# Altium footprint library Package_DFN_QFN.PcbLib: 557 footprints (part 20 of 35)
Each footprint in its own frame and in the unit in brackets; x right, y up, seen from the top. Pads: shape width x height; smd on the part's side, far side on the other; paste and mask are expansions set on the pad; w line width, h text height; cw(c..) or ccw(c..) is an arc to the next point about the centre after c.
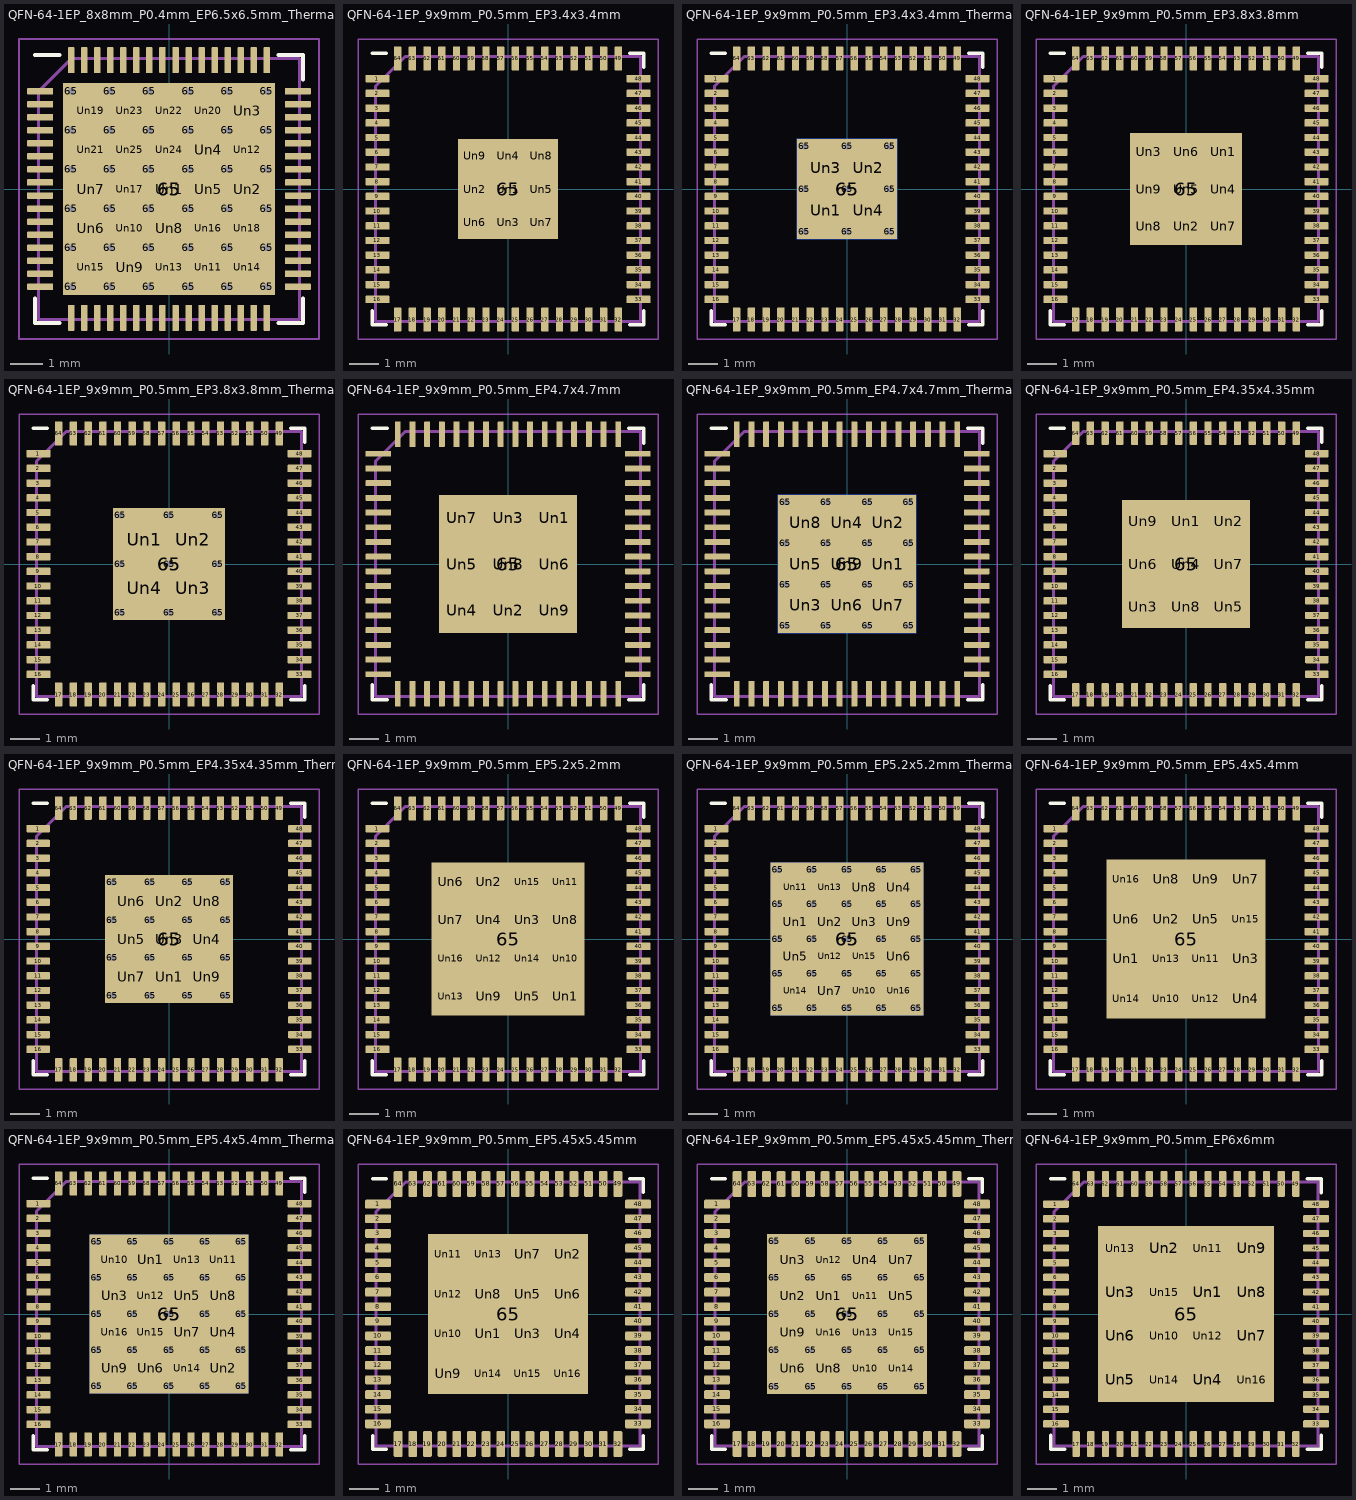
[diagram p19: the footprints below, top view; thin cyan lines are the x and y axes]

## QFN-64-1EP_8x8mm_P0.4mm_EP6.5x6.5mm_ThermalVias [mm]
pads (127):
  rrect25% 0.8x0.2 smd: 1(-3.95,3) 2(-3.95,2.6) 3(-3.95,2.2) 4(-3.95,1.8) 5(-3.95,1.4) 6(-3.95,1) 7(-3.95,0.6) 8(-3.95,0.2) 9(-3.95,-0.2) 10(-3.95,-0.6) 11(-3.95,-1) 12(-3.95,-1.4) 13(-3.95,-1.8) 14(-3.95,-2.2) 15(-3.95,-2.6) 16(-3.95,-3) 33(3.95,-3) 34(3.95,-2.6) 35(3.95,-2.2) 36(3.95,-1.8) 37(3.95,-1.4) 38(3.95,-1) 39(3.95,-0.6) 40(3.95,-0.2) 41(3.95,0.2) 42(3.95,0.6) 43(3.95,1) 44(3.95,1.4) 45(3.95,1.8) 46(3.95,2.2) 47(3.95,2.6) 48(3.95,3)
  rrect25% 0.2x0.8 smd: 17(-3,-3.95) 18(-2.6,-3.95) 19(-2.2,-3.95) 20(-1.8,-3.95) 21(-1.4,-3.95) 22(-1,-3.95) 23(-0.6,-3.95) 24(-0.2,-3.95) 25(0.2,-3.95) 26(0.6,-3.95) 27(1,-3.95) 28(1.4,-3.95) 29(1.8,-3.95) 30(2.2,-3.95) 31(2.6,-3.95) 32(3,-3.95) 49(3,3.95) 50(2.6,3.95) 51(2.2,3.95) 52(1.8,3.95) 53(1.4,3.95) 54(1,3.95) 55(0.6,3.95) 56(0.2,3.95) 57(-0.2,3.95) 58(-0.6,3.95) 59(-1,3.95) 60(-1.4,3.95) 61(-1.8,3.95) 62(-2.2,3.95) 63(-2.6,3.95) 64(-3,3.95)
  round 0.5 hole 0.2: 65(-3,-3) 65(-3,-1.8) 65(-3,-0.6) 65(-3,0.6) 65(-3,1.8) 65(-3,3) 65(-1.8,-3) 65(-1.8,-1.8) 65(-1.8,-0.6) 65(-1.8,0.6) 65(-1.8,1.8) 65(-1.8,3) 65(-0.6,-3) 65(-0.6,-1.8) 65(-0.6,-0.6) 65(-0.6,0.6) 65(-0.6,1.8) 65(-0.6,3) 65(0.6,-3) 65(0.6,-1.8) 65(0.6,-0.6) 65(0.6,0.6) 65(0.6,1.8) 65(0.6,3) 65(1.8,-3) 65(1.8,-1.8) 65(1.8,-0.6) 65(1.8,0.6) 65(1.8,1.8) 65(1.8,3) 65(3,-3) 65(3,-1.8) 65(3,-0.6) 65(3,0.6) 65(3,1.8) 65(3,3)
  rect 6.5x6.5 smd far side: 65(0,0)
  rect 6.5x6.5 smd: 65(0,0)
  rrect25% 1.007x1.007 on Top Paste: Un1(0,0) Un2(2.4,0) Un3(2.4,2.4) Un4(1.2,1.2) Un5(1.2,0) Un6(-2.4,-1.2) Un7(-2.4,0) Un8(0,-1.2) Un9(-1.2,-2.4) Un10(-1.2,-1.2) Un11(1.2,-2.4) Un12(2.4,1.2) Un13(0,-2.4) Un14(2.4,-2.4) Un15(-2.4,-2.4) Un16(1.2,-1.2) Un17(-1.2,0) Un18(2.4,-1.2) Un19(-2.4,2.4) Un20(1.2,2.4) Un21(-2.4,1.2) Un22(0,2.4) Un23(-1.2,2.4) Un24(0,1.2) Un25(-1.2,1.2)
F.SilkS:
  lines w0.12: -4.11,-3.36 -4.11,-4.11 -3.36,-4.11 ; -4.11,4.11 -3.36,4.11 ; 3.36,-4.11 4.11,-4.11 4.11,-3.36 ; 3.36,4.11 4.11,4.11 4.11,3.36
F.CrtYd:
  lines w0.05: -4.6,-4.6 -4.6,4.6 4.6,4.6 4.6,-4.6 -4.6,-4.6
F.Fab:
  lines w0.1: -4,-4 -4,3 -3,4 4,4 4,-4 -4,-4
  text "'.Designator'" at -4.047,-0.84 h1

## QFN-64-1EP_9x9mm_P0.5mm_EP3.4x3.4mm [mm]
pads (74):
  rrect25% 0.825x0.25 smd: 1(-4.437,3.75) 2(-4.437,3.25) 3(-4.437,2.75) 4(-4.437,2.25) 5(-4.437,1.75) 6(-4.437,1.25) 7(-4.437,0.75) 8(-4.437,0.25) 9(-4.437,-0.25) 10(-4.437,-0.75) 11(-4.437,-1.25) 12(-4.437,-1.75) 13(-4.437,-2.25) 14(-4.437,-2.75) 15(-4.437,-3.25) 16(-4.437,-3.75) 33(4.437,-3.75) 34(4.437,-3.25) 35(4.437,-2.75) 36(4.437,-2.25) 37(4.437,-1.75) 38(4.437,-1.25) 39(4.437,-0.75) 40(4.437,-0.25) 41(4.437,0.25) 42(4.437,0.75) 43(4.437,1.25) 44(4.437,1.75) 45(4.437,2.25) 46(4.437,2.75) 47(4.437,3.25) 48(4.437,3.75)
  rrect25% 0.25x0.825 smd: 17(-3.75,-4.437) 18(-3.25,-4.437) 19(-2.75,-4.437) 20(-2.25,-4.437) 21(-1.75,-4.437) 22(-1.25,-4.437) 23(-0.75,-4.437) 24(-0.25,-4.437) 25(0.25,-4.437) 26(0.75,-4.437) 27(1.25,-4.437) 28(1.75,-4.437) 29(2.25,-4.437) 30(2.75,-4.437) 31(3.25,-4.437) 32(3.75,-4.437) 49(3.75,4.437) 50(3.25,4.437) 51(2.75,4.437) 52(2.25,4.437) 53(1.75,4.437) 54(1.25,4.437) 55(0.75,4.437) 56(0.25,4.437) 57(-0.25,4.437) 58(-0.75,4.437) 59(-1.25,4.437) 60(-1.75,4.437) 61(-2.25,4.437) 62(-2.75,4.437) 63(-3.25,4.437) 64(-3.75,4.437)
  rect 3.4x3.4 smd: 65(0,0)
  rrect25% 0.91x0.91 on Top Paste: Un1(0,0) Un2(-1.13,0) Un3(0,-1.13) Un4(0,1.13) Un5(1.13,0) Un6(-1.13,-1.13) Un7(1.13,-1.13) Un8(1.13,1.13) Un9(-1.13,1.13)
F.SilkS:
  lines w0.12: -4.61,-4.135 -4.61,-4.61 -4.135,-4.61 ; -4.61,4.61 -4.135,4.61 ; 4.135,-4.61 4.61,-4.61 4.61,-4.135 ; 4.135,4.61 4.61,4.61 4.61,4.135
F.CrtYd:
  lines w0.05: -5.1,-5.1 5.1,-5.1 5.1,5.1 -5.1,5.1 -5.1,-5.1
F.Fab:
  lines w0.1: -4.5,-4.5 4.5,-4.5 4.5,4.5 -3.5,4.5 -4.5,3.5 -4.5,-4.5
  text "'.Designator'" at -4.047,-0.84 h1

## QFN-64-1EP_9x9mm_P0.5mm_EP3.4x3.4mm_ThermalVias [mm]
pads (79):
  rrect25% 0.825x0.25 smd: 1(-4.437,3.75) 2(-4.437,3.25) 3(-4.437,2.75) 4(-4.437,2.25) 5(-4.437,1.75) 6(-4.437,1.25) 7(-4.437,0.75) 8(-4.437,0.25) 9(-4.437,-0.25) 10(-4.437,-0.75) 11(-4.437,-1.25) 12(-4.437,-1.75) 13(-4.437,-2.25) 14(-4.437,-2.75) 15(-4.437,-3.25) 16(-4.437,-3.75) 33(4.437,-3.75) 34(4.437,-3.25) 35(4.437,-2.75) 36(4.437,-2.25) 37(4.437,-1.75) 38(4.437,-1.25) 39(4.437,-0.75) 40(4.437,-0.25) 41(4.437,0.25) 42(4.437,0.75) 43(4.437,1.25) 44(4.437,1.75) 45(4.437,2.25) 46(4.437,2.75) 47(4.437,3.25) 48(4.437,3.75)
  rrect25% 0.25x0.825 smd: 17(-3.75,-4.437) 18(-3.25,-4.437) 19(-2.75,-4.437) 20(-2.25,-4.437) 21(-1.75,-4.437) 22(-1.25,-4.437) 23(-0.75,-4.437) 24(-0.25,-4.437) 25(0.25,-4.437) 26(0.75,-4.437) 27(1.25,-4.437) 28(1.75,-4.437) 29(2.25,-4.437) 30(2.75,-4.437) 31(3.25,-4.437) 32(3.75,-4.437) 49(3.75,4.437) 50(3.25,4.437) 51(2.75,4.437) 52(2.25,4.437) 53(1.75,4.437) 54(1.25,4.437) 55(0.75,4.437) 56(0.25,4.437) 57(-0.25,4.437) 58(-0.75,4.437) 59(-1.25,4.437) 60(-1.75,4.437) 61(-2.25,4.437) 62(-2.75,4.437) 63(-3.25,4.437) 64(-3.75,4.437)
  round 0.5 hole 0.2: 65(-1.45,-1.45) 65(-1.45,0) 65(-1.45,1.45) 65(0,-1.45) 65(0,0) 65(0,1.45) 65(1.45,-1.45) 65(1.45,0) 65(1.45,1.45)
  rect 3.4x3.4 smd far side: 65(0,0)
  rect 3.4x3.4 smd: 65(0,0)
  round 1.227 on Top Paste: Un1(-0.725,-0.725) Un2(0.725,0.725) Un3(-0.725,0.725) Un4(0.725,-0.725)
F.SilkS:
  lines w0.12: -4.61,-4.135 -4.61,-4.61 -4.135,-4.61 ; -4.61,4.61 -4.135,4.61 ; 4.135,-4.61 4.61,-4.61 4.61,-4.135 ; 4.135,4.61 4.61,4.61 4.61,4.135
F.Paste:
  region: -0.184,-0.303 -0.184,-1.147 -0.303,-1.266 -1.147,-1.266 -1.266,-1.147 -1.266,-0.303 -1.147,-0.184 -0.303,-0.184
  region: 1.266,1.147 1.266,0.303 1.147,0.184 0.303,0.184 0.184,0.303 0.184,1.147 0.303,1.266 1.147,1.266
  region: -0.184,1.147 -0.184,0.303 -0.303,0.184 -1.147,0.184 -1.266,0.303 -1.266,1.147 -1.147,1.266 -0.303,1.266
  region: 1.266,-0.303 1.266,-1.147 1.147,-1.266 0.303,-1.266 0.184,-1.147 0.184,-0.303 0.303,-0.184 1.147,-0.184
F.CrtYd:
  lines w0.05: -5.1,-5.1 -5.1,5.1 5.1,5.1 5.1,-5.1 -5.1,-5.1
F.Fab:
  lines w0.1: -4.5,-4.5 -4.5,3.5 -3.5,4.5 4.5,4.5 4.5,-4.5 -4.5,-4.5
  text "'.Designator'" at -4.047,-0.84 h1

## QFN-64-1EP_9x9mm_P0.5mm_EP3.8x3.8mm [mm]
pads (74):
  rrect25% 0.825x0.25 smd: 1(-4.437,3.75) 2(-4.437,3.25) 3(-4.437,2.75) 4(-4.437,2.25) 5(-4.437,1.75) 6(-4.437,1.25) 7(-4.437,0.75) 8(-4.437,0.25) 9(-4.437,-0.25) 10(-4.437,-0.75) 11(-4.437,-1.25) 12(-4.437,-1.75) 13(-4.437,-2.25) 14(-4.437,-2.75) 15(-4.437,-3.25) 16(-4.437,-3.75) 33(4.437,-3.75) 34(4.437,-3.25) 35(4.437,-2.75) 36(4.437,-2.25) 37(4.437,-1.75) 38(4.437,-1.25) 39(4.437,-0.75) 40(4.437,-0.25) 41(4.437,0.25) 42(4.437,0.75) 43(4.437,1.25) 44(4.437,1.75) 45(4.437,2.25) 46(4.437,2.75) 47(4.437,3.25) 48(4.437,3.75)
  rrect25% 0.25x0.825 smd: 17(-3.75,-4.437) 18(-3.25,-4.437) 19(-2.75,-4.437) 20(-2.25,-4.437) 21(-1.75,-4.437) 22(-1.25,-4.437) 23(-0.75,-4.437) 24(-0.25,-4.437) 25(0.25,-4.437) 26(0.75,-4.437) 27(1.25,-4.437) 28(1.75,-4.437) 29(2.25,-4.437) 30(2.75,-4.437) 31(3.25,-4.437) 32(3.75,-4.437) 49(3.75,4.437) 50(3.25,4.437) 51(2.75,4.437) 52(2.25,4.437) 53(1.75,4.437) 54(1.25,4.437) 55(0.75,4.437) 56(0.25,4.437) 57(-0.25,4.437) 58(-0.75,4.437) 59(-1.25,4.437) 60(-1.75,4.437) 61(-2.25,4.437) 62(-2.75,4.437) 63(-3.25,4.437) 64(-3.75,4.437)
  rect 3.8x3.8 smd: 65(0,0)
  rrect25% 1.02x1.02 on Top Paste: Un1(1.27,1.27) Un2(0,-1.27) Un3(-1.27,1.27) Un4(1.27,0) Un5(0,0) Un6(0,1.27) Un7(1.27,-1.27) Un8(-1.27,-1.27) Un9(-1.27,0)
F.SilkS:
  lines w0.12: -4.61,-4.135 -4.61,-4.61 -4.135,-4.61 ; -4.61,4.61 -4.135,4.61 ; 4.135,-4.61 4.61,-4.61 4.61,-4.135 ; 4.135,4.61 4.61,4.61 4.61,4.135
F.CrtYd:
  lines w0.05: -5.1,-5.1 -5.1,5.1 5.1,5.1 5.1,-5.1 -5.1,-5.1
F.Fab:
  lines w0.1: -4.5,-4.5 4.5,-4.5 4.5,4.5 -3.5,4.5 -4.5,3.5 -4.5,-4.5
  text "'.Designator'" at -4.047,-0.84 h1

## QFN-64-1EP_9x9mm_P0.5mm_EP3.8x3.8mm_ThermalVias [mm]
pads (79):
  rrect25% 0.825x0.25 smd: 1(-4.437,3.75) 2(-4.437,3.25) 3(-4.437,2.75) 4(-4.437,2.25) 5(-4.437,1.75) 6(-4.437,1.25) 7(-4.437,0.75) 8(-4.437,0.25) 9(-4.437,-0.25) 10(-4.437,-0.75) 11(-4.437,-1.25) 12(-4.437,-1.75) 13(-4.437,-2.25) 14(-4.437,-2.75) 15(-4.437,-3.25) 16(-4.437,-3.75) 33(4.437,-3.75) 34(4.437,-3.25) 35(4.437,-2.75) 36(4.437,-2.25) 37(4.437,-1.75) 38(4.437,-1.25) 39(4.437,-0.75) 40(4.437,-0.25) 41(4.437,0.25) 42(4.437,0.75) 43(4.437,1.25) 44(4.437,1.75) 45(4.437,2.25) 46(4.437,2.75) 47(4.437,3.25) 48(4.437,3.75)
  rrect25% 0.25x0.825 smd: 17(-3.75,-4.437) 18(-3.25,-4.437) 19(-2.75,-4.437) 20(-2.25,-4.437) 21(-1.75,-4.437) 22(-1.25,-4.437) 23(-0.75,-4.437) 24(-0.25,-4.437) 25(0.25,-4.437) 26(0.75,-4.437) 27(1.25,-4.437) 28(1.75,-4.437) 29(2.25,-4.437) 30(2.75,-4.437) 31(3.25,-4.437) 32(3.75,-4.437) 49(3.75,4.437) 50(3.25,4.437) 51(2.75,4.437) 52(2.25,4.437) 53(1.75,4.437) 54(1.25,4.437) 55(0.75,4.437) 56(0.25,4.437) 57(-0.25,4.437) 58(-0.75,4.437) 59(-1.25,4.437) 60(-1.75,4.437) 61(-2.25,4.437) 62(-2.75,4.437) 63(-3.25,4.437) 64(-3.75,4.437)
  round 0.5 hole 0.2: 65(-1.65,-1.65) 65(-1.65,0) 65(-1.65,1.65) 65(0,-1.65) 65(0,0) 65(0,1.65) 65(1.65,-1.65) 65(1.65,0) 65(1.65,1.65)
  rect 3.8x3.8 smd far side: 65(0,0)
  rect 3.8x3.8 smd: 65(0,0)
  round 1.415 on Top Paste: Un1(-0.825,0.825) Un2(0.825,0.825) Un3(0.825,-0.825) Un4(-0.825,-0.825)
F.SilkS:
  lines w0.12: -4.61,-4.135 -4.61,-4.61 -4.135,-4.61 ; -4.61,4.61 -4.135,4.61 ; 4.135,-4.61 4.61,-4.61 4.61,-4.135 ; 4.135,4.61 4.61,4.61 4.61,4.135
F.Paste:
  region: -0.176,1.378 -0.176,0.272 -0.272,0.176 -1.378,0.176 -1.474,0.272 -1.474,1.378 -1.378,1.474 -0.272,1.474
  region: 1.474,1.378 1.474,0.272 1.378,0.176 0.272,0.176 0.176,0.272 0.176,1.378 0.272,1.474 1.378,1.474
  region: 1.474,-0.272 1.474,-1.378 1.378,-1.474 0.272,-1.474 0.176,-1.378 0.176,-0.272 0.272,-0.176 1.378,-0.176
  region: -0.176,-0.272 -0.176,-1.378 -0.272,-1.474 -1.378,-1.474 -1.474,-1.378 -1.474,-0.272 -1.378,-0.176 -0.272,-0.176
F.CrtYd:
  lines w0.05: -5.1,-5.1 5.1,-5.1 5.1,5.1 -5.1,5.1 -5.1,-5.1
F.Fab:
  lines w0.1: -4.5,-4.5 4.5,-4.5 4.5,4.5 -3.5,4.5 -4.5,3.5 -4.5,-4.5
  text "'.Designator'" at -4.047,-0.84 h1

## QFN-64-1EP_9x9mm_P0.5mm_EP4.7x4.7mm [mm]
pads (74):
  rrect25% 0.875x0.2 smd: 1(-4.413,3.75) 2(-4.413,3.25) 3(-4.413,2.75) 4(-4.413,2.25) 5(-4.413,1.75) 6(-4.413,1.25) 7(-4.413,0.75) 8(-4.413,0.25) 9(-4.413,-0.25) 10(-4.413,-0.75) 11(-4.413,-1.25) 12(-4.413,-1.75) 13(-4.413,-2.25) 14(-4.413,-2.75) 15(-4.413,-3.25) 16(-4.413,-3.75) 33(4.413,-3.75) 34(4.413,-3.25) 35(4.413,-2.75) 36(4.413,-2.25) 37(4.413,-1.75) 38(4.413,-1.25) 39(4.413,-0.75) 40(4.413,-0.25) 41(4.413,0.25) 42(4.413,0.75) 43(4.413,1.25) 44(4.413,1.75) 45(4.413,2.25) 46(4.413,2.75) 47(4.413,3.25) 48(4.413,3.75)
  rrect25% 0.2x0.875 smd: 17(-3.75,-4.413) 18(-3.25,-4.413) 19(-2.75,-4.413) 20(-2.25,-4.413) 21(-1.75,-4.413) 22(-1.25,-4.413) 23(-0.75,-4.413) 24(-0.25,-4.413) 25(0.25,-4.413) 26(0.75,-4.413) 27(1.25,-4.413) 28(1.75,-4.413) 29(2.25,-4.413) 30(2.75,-4.413) 31(3.25,-4.413) 32(3.75,-4.413) 49(3.75,4.413) 50(3.25,4.413) 51(2.75,4.413) 52(2.25,4.413) 53(1.75,4.413) 54(1.25,4.413) 55(0.75,4.413) 56(0.25,4.413) 57(-0.25,4.413) 58(-0.75,4.413) 59(-1.25,4.413) 60(-1.75,4.413) 61(-2.25,4.413) 62(-2.75,4.413) 63(-3.25,4.413) 64(-3.75,4.413)
  rect 4.7x4.7 smd: 65(0,0)
  rrect20% 1.26x1.26 on Top Paste: Un1(1.57,1.57) Un2(0,-1.57) Un3(0,1.57) Un4(-1.57,-1.57) Un5(-1.57,0) Un6(1.57,0) Un7(-1.57,1.57) Un8(0,0) Un9(1.57,-1.57)
F.SilkS:
  lines w0.12: -4.61,-4.11 -4.61,-4.61 -4.11,-4.61 ; -4.61,4.61 -4.11,4.61 ; 4.11,-4.61 4.61,-4.61 4.61,-4.11 ; 4.11,4.61 4.61,4.61 4.61,4.11
F.CrtYd:
  lines w0.05: -5.1,-5.1 -5.1,5.1 5.1,5.1 5.1,-5.1 -5.1,-5.1
F.Fab:
  lines w0.1: -4.5,-4.5 -4.5,3.5 -3.5,4.5 4.5,4.5 4.5,-4.5 -4.5,-4.5
  text "'.Designator'" at -4.047,-0.84 h1

## QFN-64-1EP_9x9mm_P0.5mm_EP4.7x4.7mm_ThermalVias [mm]
pads (91):
  rrect25% 0.875x0.2 smd: 1(-4.413,3.75) 2(-4.413,3.25) 3(-4.413,2.75) 4(-4.413,2.25) 5(-4.413,1.75) 6(-4.413,1.25) 7(-4.413,0.75) 8(-4.413,0.25) 9(-4.413,-0.25) 10(-4.413,-0.75) 11(-4.413,-1.25) 12(-4.413,-1.75) 13(-4.413,-2.25) 14(-4.413,-2.75) 15(-4.413,-3.25) 16(-4.413,-3.75) 33(4.413,-3.75) 34(4.413,-3.25) 35(4.413,-2.75) 36(4.413,-2.25) 37(4.413,-1.75) 38(4.413,-1.25) 39(4.413,-0.75) 40(4.413,-0.25) 41(4.413,0.25) 42(4.413,0.75) 43(4.413,1.25) 44(4.413,1.75) 45(4.413,2.25) 46(4.413,2.75) 47(4.413,3.25) 48(4.413,3.75)
  rrect25% 0.2x0.875 smd: 17(-3.75,-4.413) 18(-3.25,-4.413) 19(-2.75,-4.413) 20(-2.25,-4.413) 21(-1.75,-4.413) 22(-1.25,-4.413) 23(-0.75,-4.413) 24(-0.25,-4.413) 25(0.25,-4.413) 26(0.75,-4.413) 27(1.25,-4.413) 28(1.75,-4.413) 29(2.25,-4.413) 30(2.75,-4.413) 31(3.25,-4.413) 32(3.75,-4.413) 49(3.75,4.413) 50(3.25,4.413) 51(2.75,4.413) 52(2.25,4.413) 53(1.75,4.413) 54(1.25,4.413) 55(0.75,4.413) 56(0.25,4.413) 57(-0.25,4.413) 58(-0.75,4.413) 59(-1.25,4.413) 60(-1.75,4.413) 61(-2.25,4.413) 62(-2.75,4.413) 63(-3.25,4.413) 64(-3.75,4.413)
  round 0.5 hole 0.2: 65(-2.1,-2.1) 65(-2.1,-0.7) 65(-2.1,0.7) 65(-2.1,2.1) 65(-0.7,-2.1) 65(-0.7,-0.7) 65(-0.7,0.7) 65(-0.7,2.1) 65(0.7,-2.1) 65(0.7,-0.7) 65(0.7,0.7) 65(0.7,2.1) 65(2.1,-2.1) 65(2.1,-0.7) 65(2.1,0.7) 65(2.1,2.1)
  rect 4.7x4.7 smd far side: 65(0,0)
  rect 4.7x4.7 smd: 65(0,0)
  rrect20% 1.263x1.263 on Top Paste: Un1(1.4,0) Un2(1.4,1.4) Un3(-1.4,-1.4) Un4(0,1.4) Un5(-1.4,0) Un6(0,-1.4) Un7(1.4,-1.4) Un8(-1.4,1.4) Un9(0,0)
F.SilkS:
  lines w0.12: -4.61,-4.11 -4.61,-4.61 -4.11,-4.61 ; -4.61,4.61 -4.11,4.61 ; 4.11,-4.61 4.61,-4.61 4.61,-4.11 ; 4.11,4.61 4.61,4.61 4.61,4.11
F.CrtYd:
  lines w0.05: -5.1,-5.1 -5.1,5.1 5.1,5.1 5.1,-5.1 -5.1,-5.1
F.Fab:
  lines w0.1: -4.5,-4.5 4.5,-4.5 4.5,4.5 -3.5,4.5 -4.5,3.5 -4.5,-4.5
  text "'.Designator'" at -4.047,-0.84 h1

## QFN-64-1EP_9x9mm_P0.5mm_EP4.35x4.35mm [mm]
pads (74):
  rrect25% 0.8x0.25 smd: 1(-4.45,3.75) 2(-4.45,3.25) 3(-4.45,2.75) 4(-4.45,2.25) 5(-4.45,1.75) 6(-4.45,1.25) 7(-4.45,0.75) 8(-4.45,0.25) 9(-4.45,-0.25) 10(-4.45,-0.75) 11(-4.45,-1.25) 12(-4.45,-1.75) 13(-4.45,-2.25) 14(-4.45,-2.75) 15(-4.45,-3.25) 16(-4.45,-3.75) 33(4.45,-3.75) 34(4.45,-3.25) 35(4.45,-2.75) 36(4.45,-2.25) 37(4.45,-1.75) 38(4.45,-1.25) 39(4.45,-0.75) 40(4.45,-0.25) 41(4.45,0.25) 42(4.45,0.75) 43(4.45,1.25) 44(4.45,1.75) 45(4.45,2.25) 46(4.45,2.75) 47(4.45,3.25) 48(4.45,3.75)
  rrect25% 0.25x0.8 smd: 17(-3.75,-4.45) 18(-3.25,-4.45) 19(-2.75,-4.45) 20(-2.25,-4.45) 21(-1.75,-4.45) 22(-1.25,-4.45) 23(-0.75,-4.45) 24(-0.25,-4.45) 25(0.25,-4.45) 26(0.75,-4.45) 27(1.25,-4.45) 28(1.75,-4.45) 29(2.25,-4.45) 30(2.75,-4.45) 31(3.25,-4.45) 32(3.75,-4.45) 49(3.75,4.45) 50(3.25,4.45) 51(2.75,4.45) 52(2.25,4.45) 53(1.75,4.45) 54(1.25,4.45) 55(0.75,4.45) 56(0.25,4.45) 57(-0.25,4.45) 58(-0.75,4.45) 59(-1.25,4.45) 60(-1.75,4.45) 61(-2.25,4.45) 62(-2.75,4.45) 63(-3.25,4.45) 64(-3.75,4.45)
  rect 4.35x4.35 smd: 65(0,0)
  rrect21% 1.17x1.17 on Top Paste: Un1(0,1.45) Un2(1.45,1.45) Un3(-1.45,-1.45) Un4(0,0) Un5(1.45,-1.45) Un6(-1.45,0) Un7(1.45,0) Un8(0,-1.45) Un9(-1.45,1.45)
F.SilkS:
  lines w0.12: -4.61,-4.135 -4.61,-4.61 -4.135,-4.61 ; -4.61,4.61 -4.135,4.61 ; 4.135,-4.61 4.61,-4.61 4.61,-4.135 ; 4.135,4.61 4.61,4.61 4.61,4.135
F.CrtYd:
  lines w0.05: -5.1,-5.1 -5.1,5.1 5.1,5.1 5.1,-5.1 -5.1,-5.1
F.Fab:
  lines w0.1: -4.5,-4.5 4.5,-4.5 4.5,4.5 -3.5,4.5 -4.5,3.5 -4.5,-4.5
  text "'.Designator'" at -4.047,-0.84 h1

## QFN-64-1EP_9x9mm_P0.5mm_EP4.35x4.35mm_ThermalVias [mm]
pads (91):
  rrect25% 0.8x0.25 smd: 1(-4.45,3.75) 2(-4.45,3.25) 3(-4.45,2.75) 4(-4.45,2.25) 5(-4.45,1.75) 6(-4.45,1.25) 7(-4.45,0.75) 8(-4.45,0.25) 9(-4.45,-0.25) 10(-4.45,-0.75) 11(-4.45,-1.25) 12(-4.45,-1.75) 13(-4.45,-2.25) 14(-4.45,-2.75) 15(-4.45,-3.25) 16(-4.45,-3.75) 33(4.45,-3.75) 34(4.45,-3.25) 35(4.45,-2.75) 36(4.45,-2.25) 37(4.45,-1.75) 38(4.45,-1.25) 39(4.45,-0.75) 40(4.45,-0.25) 41(4.45,0.25) 42(4.45,0.75) 43(4.45,1.25) 44(4.45,1.75) 45(4.45,2.25) 46(4.45,2.75) 47(4.45,3.25) 48(4.45,3.75)
  rrect25% 0.25x0.8 smd: 17(-3.75,-4.45) 18(-3.25,-4.45) 19(-2.75,-4.45) 20(-2.25,-4.45) 21(-1.75,-4.45) 22(-1.25,-4.45) 23(-0.75,-4.45) 24(-0.25,-4.45) 25(0.25,-4.45) 26(0.75,-4.45) 27(1.25,-4.45) 28(1.75,-4.45) 29(2.25,-4.45) 30(2.75,-4.45) 31(3.25,-4.45) 32(3.75,-4.45) 49(3.75,4.45) 50(3.25,4.45) 51(2.75,4.45) 52(2.25,4.45) 53(1.75,4.45) 54(1.25,4.45) 55(0.75,4.45) 56(0.25,4.45) 57(-0.25,4.45) 58(-0.75,4.45) 59(-1.25,4.45) 60(-1.75,4.45) 61(-2.25,4.45) 62(-2.75,4.45) 63(-3.25,4.45) 64(-3.75,4.45)
  round 0.5 hole 0.2: 65(-1.925,-1.925) 65(-1.925,-0.642) 65(-1.925,0.642) 65(-1.925,1.925) 65(-0.642,-1.925) 65(-0.642,-0.642) 65(-0.642,0.642) 65(-0.642,1.925) 65(0.642,-1.925) 65(0.642,-0.642) 65(0.642,0.642) 65(0.642,1.925) 65(1.925,-1.925) 65(1.925,-0.642) 65(1.925,0.642) 65(1.925,1.925)
  rect 4.35x4.35 smd: 65(0,0)
  rect 4.35x4.35 smd far side: 65(0,0)
  rrect22% 1.123x1.123 on Top Paste: Un1(0,-1.283) Un2(0,1.283) Un3(0,0) Un4(1.283,0) Un5(-1.283,0) Un6(-1.283,1.283) Un7(-1.283,-1.283) Un8(1.283,1.283) Un9(1.283,-1.283)
F.SilkS:
  lines w0.12: -4.61,-4.135 -4.61,-4.61 -4.135,-4.61 ; -4.61,4.61 -4.135,4.61 ; 4.135,-4.61 4.61,-4.61 4.61,-4.135 ; 4.135,4.61 4.61,4.61 4.61,4.135
F.CrtYd:
  lines w0.05: -5.1,-5.1 5.1,-5.1 5.1,5.1 -5.1,5.1 -5.1,-5.1
F.Fab:
  lines w0.1: -4.5,-4.5 4.5,-4.5 4.5,4.5 -3.5,4.5 -4.5,3.5 -4.5,-4.5
  text "'.Designator'" at -4.047,-0.84 h1

## QFN-64-1EP_9x9mm_P0.5mm_EP5.2x5.2mm [mm]
pads (81):
  rrect25% 0.825x0.25 smd: 1(-4.437,3.75) 2(-4.437,3.25) 3(-4.437,2.75) 4(-4.437,2.25) 5(-4.437,1.75) 6(-4.437,1.25) 7(-4.437,0.75) 8(-4.437,0.25) 9(-4.437,-0.25) 10(-4.437,-0.75) 11(-4.437,-1.25) 12(-4.437,-1.75) 13(-4.437,-2.25) 14(-4.437,-2.75) 15(-4.437,-3.25) 16(-4.437,-3.75) 33(4.437,-3.75) 34(4.437,-3.25) 35(4.437,-2.75) 36(4.437,-2.25) 37(4.437,-1.75) 38(4.437,-1.25) 39(4.437,-0.75) 40(4.437,-0.25) 41(4.437,0.25) 42(4.437,0.75) 43(4.437,1.25) 44(4.437,1.75) 45(4.437,2.25) 46(4.437,2.75) 47(4.437,3.25) 48(4.437,3.75)
  rrect25% 0.25x0.825 smd: 17(-3.75,-4.437) 18(-3.25,-4.437) 19(-2.75,-4.437) 20(-2.25,-4.437) 21(-1.75,-4.437) 22(-1.25,-4.437) 23(-0.75,-4.437) 24(-0.25,-4.437) 25(0.25,-4.437) 26(0.75,-4.437) 27(1.25,-4.437) 28(1.75,-4.437) 29(2.25,-4.437) 30(2.75,-4.437) 31(3.25,-4.437) 32(3.75,-4.437) 49(3.75,4.437) 50(3.25,4.437) 51(2.75,4.437) 52(2.25,4.437) 53(1.75,4.437) 54(1.25,4.437) 55(0.75,4.437) 56(0.25,4.437) 57(-0.25,4.437) 58(-0.75,4.437) 59(-1.25,4.437) 60(-1.75,4.437) 61(-2.25,4.437) 62(-2.75,4.437) 63(-3.25,4.437) 64(-3.75,4.437)
  rect 5.2x5.2 smd: 65(0,0)
  rrect24% 1.05x1.05 on Top Paste: Un1(1.95,-1.95) Un2(-0.65,1.95) Un3(0.65,0.65) Un4(-0.65,0.65) Un5(0.65,-1.95) Un6(-1.95,1.95) Un7(-1.95,0.65) Un8(1.95,0.65) Un9(-0.65,-1.95) Un10(1.95,-0.65) Un11(1.95,1.95) Un12(-0.65,-0.65) Un13(-1.95,-1.95) Un14(0.65,-0.65) Un15(0.65,1.95) Un16(-1.95,-0.65)
F.SilkS:
  lines w0.12: -4.61,-4.135 -4.61,-4.61 -4.135,-4.61 ; -4.61,4.61 -4.135,4.61 ; 4.135,-4.61 4.61,-4.61 4.61,-4.135 ; 4.135,4.61 4.61,4.61 4.61,4.135
F.CrtYd:
  lines w0.05: -5.1,-5.1 5.1,-5.1 5.1,5.1 -5.1,5.1 -5.1,-5.1
F.Fab:
  lines w0.1: -4.5,-4.5 -4.5,3.5 -3.5,4.5 4.5,4.5 4.5,-4.5 -4.5,-4.5
  text "'.Designator'" at -4.047,-0.84 h1

## QFN-64-1EP_9x9mm_P0.5mm_EP5.2x5.2mm_ThermalVias [mm]
pads (107):
  rrect25% 0.825x0.25 smd: 1(-4.437,3.75) 2(-4.437,3.25) 3(-4.437,2.75) 4(-4.437,2.25) 5(-4.437,1.75) 6(-4.437,1.25) 7(-4.437,0.75) 8(-4.437,0.25) 9(-4.437,-0.25) 10(-4.437,-0.75) 11(-4.437,-1.25) 12(-4.437,-1.75) 13(-4.437,-2.25) 14(-4.437,-2.75) 15(-4.437,-3.25) 16(-4.437,-3.75) 33(4.437,-3.75) 34(4.437,-3.25) 35(4.437,-2.75) 36(4.437,-2.25) 37(4.437,-1.75) 38(4.437,-1.25) 39(4.437,-0.75) 40(4.437,-0.25) 41(4.437,0.25) 42(4.437,0.75) 43(4.437,1.25) 44(4.437,1.75) 45(4.437,2.25) 46(4.437,2.75) 47(4.437,3.25) 48(4.437,3.75)
  rrect25% 0.25x0.825 smd: 17(-3.75,-4.437) 18(-3.25,-4.437) 19(-2.75,-4.437) 20(-2.25,-4.437) 21(-1.75,-4.437) 22(-1.25,-4.437) 23(-0.75,-4.437) 24(-0.25,-4.437) 25(0.25,-4.437) 26(0.75,-4.437) 27(1.25,-4.437) 28(1.75,-4.437) 29(2.25,-4.437) 30(2.75,-4.437) 31(3.25,-4.437) 32(3.75,-4.437) 49(3.75,4.437) 50(3.25,4.437) 51(2.75,4.437) 52(2.25,4.437) 53(1.75,4.437) 54(1.25,4.437) 55(0.75,4.437) 56(0.25,4.437) 57(-0.25,4.437) 58(-0.75,4.437) 59(-1.25,4.437) 60(-1.75,4.437) 61(-2.25,4.437) 62(-2.75,4.437) 63(-3.25,4.437) 64(-3.75,4.437)
  round 0.5 hole 0.2: 65(-2.35,-2.35) 65(-2.35,-1.175) 65(-2.35,0) 65(-2.35,1.175) 65(-2.35,2.35) 65(-1.175,-2.35) 65(-1.175,-1.175) 65(-1.175,0) 65(-1.175,1.175) 65(-1.175,2.35) 65(0,-2.35) 65(0,-1.175) 65(0,0) 65(0,1.175) 65(0,2.35) 65(1.175,-2.35) 65(1.175,-1.175) 65(1.175,0) 65(1.175,1.175) 65(1.175,2.35) 65(2.35,-2.35) 65(2.35,-1.175) 65(2.35,0) 65(2.35,1.175) 65(2.35,2.35)
  rect 5.2x5.2 smd far side: 65(0,0)
  rect 5.2x5.2 smd: 65(0,0)
  rrect25% 1.007x1.007 on Top Paste: Un1(-1.763,0.587) Un2(-0.587,0.587) Un3(0.587,0.587) Un4(1.763,1.763) Un5(-1.763,-0.587) Un6(1.763,-0.587) Un7(-0.587,-1.763) Un8(0.587,1.763) Un9(1.763,0.587) Un10(0.587,-1.763) Un11(-1.763,1.763) Un12(-0.587,-0.587) Un13(-0.587,1.763) Un14(-1.763,-1.763) Un15(0.587,-0.587) Un16(1.763,-1.763)
F.SilkS:
  lines w0.12: -4.61,-4.135 -4.61,-4.61 -4.135,-4.61 ; -4.61,4.61 -4.135,4.61 ; 4.135,-4.61 4.61,-4.61 4.61,-4.135 ; 4.135,4.61 4.61,4.61 4.61,4.135
F.CrtYd:
  lines w0.05: -5.1,-5.1 5.1,-5.1 5.1,5.1 -5.1,5.1 -5.1,-5.1
F.Fab:
  lines w0.1: -4.5,-4.5 -4.5,3.5 -3.5,4.5 4.5,4.5 4.5,-4.5 -4.5,-4.5
  text "'.Designator'" at -4.047,-0.84 h1

## QFN-64-1EP_9x9mm_P0.5mm_EP5.4x5.4mm [mm]
pads (81):
  rrect25% 0.825x0.25 smd: 1(-4.437,3.75) 2(-4.437,3.25) 3(-4.437,2.75) 4(-4.437,2.25) 5(-4.437,1.75) 6(-4.437,1.25) 7(-4.437,0.75) 8(-4.437,0.25) 9(-4.437,-0.25) 10(-4.437,-0.75) 11(-4.437,-1.25) 12(-4.437,-1.75) 13(-4.437,-2.25) 14(-4.437,-2.75) 15(-4.437,-3.25) 16(-4.437,-3.75) 33(4.437,-3.75) 34(4.437,-3.25) 35(4.437,-2.75) 36(4.437,-2.25) 37(4.437,-1.75) 38(4.437,-1.25) 39(4.437,-0.75) 40(4.437,-0.25) 41(4.437,0.25) 42(4.437,0.75) 43(4.437,1.25) 44(4.437,1.75) 45(4.437,2.25) 46(4.437,2.75) 47(4.437,3.25) 48(4.437,3.75)
  rrect25% 0.25x0.825 smd: 17(-3.75,-4.437) 18(-3.25,-4.437) 19(-2.75,-4.437) 20(-2.25,-4.437) 21(-1.75,-4.437) 22(-1.25,-4.437) 23(-0.75,-4.437) 24(-0.25,-4.437) 25(0.25,-4.437) 26(0.75,-4.437) 27(1.25,-4.437) 28(1.75,-4.437) 29(2.25,-4.437) 30(2.75,-4.437) 31(3.25,-4.437) 32(3.75,-4.437) 49(3.75,4.437) 50(3.25,4.437) 51(2.75,4.437) 52(2.25,4.437) 53(1.75,4.437) 54(1.25,4.437) 55(0.75,4.437) 56(0.25,4.437) 57(-0.25,4.437) 58(-0.75,4.437) 59(-1.25,4.437) 60(-1.75,4.437) 61(-2.25,4.437) 62(-2.75,4.437) 63(-3.25,4.437) 64(-3.75,4.437)
  rect 5.4x5.4 smd: 65(0,0)
  rrect23% 1.09x1.09 on Top Paste: Un1(-2.025,-0.675) Un2(-0.675,0.675) Un3(2.025,-0.675) Un4(2.025,-2.025) Un5(0.675,0.675) Un6(-2.025,0.675) Un7(2.025,2.025) Un8(-0.675,2.025) Un9(0.675,2.025) Un10(-0.675,-2.025) Un11(0.675,-0.675) Un12(0.675,-2.025) Un13(-0.675,-0.675) Un14(-2.025,-2.025) Un15(2.025,0.675) Un16(-2.025,2.025)
F.SilkS:
  lines w0.12: -4.61,-4.135 -4.61,-4.61 -4.135,-4.61 ; -4.61,4.61 -4.135,4.61 ; 4.135,-4.61 4.61,-4.61 4.61,-4.135 ; 4.135,4.61 4.61,4.61 4.61,4.135
F.CrtYd:
  lines w0.05: -5.1,-5.1 -5.1,5.1 5.1,5.1 5.1,-5.1 -5.1,-5.1
F.Fab:
  lines w0.1: -4.5,-4.5 4.5,-4.5 4.5,4.5 -3.5,4.5 -4.5,3.5 -4.5,-4.5
  text "'.Designator'" at -4.047,-0.84 h1

## QFN-64-1EP_9x9mm_P0.5mm_EP5.4x5.4mm_ThermalVias [mm]
pads (107):
  rrect25% 0.825x0.25 smd: 1(-4.437,3.75) 2(-4.437,3.25) 3(-4.437,2.75) 4(-4.437,2.25) 5(-4.437,1.75) 6(-4.437,1.25) 7(-4.437,0.75) 8(-4.437,0.25) 9(-4.437,-0.25) 10(-4.437,-0.75) 11(-4.437,-1.25) 12(-4.437,-1.75) 13(-4.437,-2.25) 14(-4.437,-2.75) 15(-4.437,-3.25) 16(-4.437,-3.75) 33(4.437,-3.75) 34(4.437,-3.25) 35(4.437,-2.75) 36(4.437,-2.25) 37(4.437,-1.75) 38(4.437,-1.25) 39(4.437,-0.75) 40(4.437,-0.25) 41(4.437,0.25) 42(4.437,0.75) 43(4.437,1.25) 44(4.437,1.75) 45(4.437,2.25) 46(4.437,2.75) 47(4.437,3.25) 48(4.437,3.75)
  rrect25% 0.25x0.825 smd: 17(-3.75,-4.437) 18(-3.25,-4.437) 19(-2.75,-4.437) 20(-2.25,-4.437) 21(-1.75,-4.437) 22(-1.25,-4.437) 23(-0.75,-4.437) 24(-0.25,-4.437) 25(0.25,-4.437) 26(0.75,-4.437) 27(1.25,-4.437) 28(1.75,-4.437) 29(2.25,-4.437) 30(2.75,-4.437) 31(3.25,-4.437) 32(3.75,-4.437) 49(3.75,4.437) 50(3.25,4.437) 51(2.75,4.437) 52(2.25,4.437) 53(1.75,4.437) 54(1.25,4.437) 55(0.75,4.437) 56(0.25,4.437) 57(-0.25,4.437) 58(-0.75,4.437) 59(-1.25,4.437) 60(-1.75,4.437) 61(-2.25,4.437) 62(-2.75,4.437) 63(-3.25,4.437) 64(-3.75,4.437)
  round 0.5 hole 0.2: 65(-2.45,-2.45) 65(-2.45,-1.225) 65(-2.45,0) 65(-2.45,1.225) 65(-2.45,2.45) 65(-1.225,-2.45) 65(-1.225,-1.225) 65(-1.225,0) 65(-1.225,1.225) 65(-1.225,2.45) 65(0,-2.45) 65(0,-1.225) 65(0,0) 65(0,1.225) 65(0,2.45) 65(1.225,-2.45) 65(1.225,-1.225) 65(1.225,0) 65(1.225,1.225) 65(1.225,2.45) 65(2.45,-2.45) 65(2.45,-1.225) 65(2.45,0) 65(2.45,1.225) 65(2.45,2.45)
  rect 5.4x5.4 smd: 65(0,0)
  rect 5.4x5.4 smd far side: 65(0,0)
  rrect23% 1.088x1.088 on Top Paste: Un1(-0.613,1.837) Un2(1.837,-1.837) Un3(-1.837,0.613) Un4(1.837,-0.613) Un5(0.613,0.613) Un6(-0.613,-1.837) Un7(0.613,-0.613) Un8(1.837,0.613) Un9(-1.837,-1.837) Un10(-1.837,1.837) Un11(1.837,1.837) Un12(-0.613,0.613) Un13(0.613,1.837) Un14(0.613,-1.837) Un15(-0.613,-0.613) Un16(-1.837,-0.613)
F.SilkS:
  lines w0.12: -4.61,-4.135 -4.61,-4.61 -4.135,-4.61 ; -4.61,4.61 -4.135,4.61 ; 4.135,-4.61 4.61,-4.61 4.61,-4.135 ; 4.135,4.61 4.61,4.61 4.61,4.135
F.CrtYd:
  lines w0.05: -5.1,-5.1 5.1,-5.1 5.1,5.1 -5.1,5.1 -5.1,-5.1
F.Fab:
  lines w0.1: -4.5,-4.5 4.5,-4.5 4.5,4.5 -3.5,4.5 -4.5,3.5 -4.5,-4.5
  text "'.Designator'" at -4.047,-0.84 h1

## QFN-64-1EP_9x9mm_P0.5mm_EP5.45x5.45mm [mm]
pads (81):
  rrect25% 0.875x0.3 smd: 1(-4.437,3.75) 2(-4.437,3.25) 3(-4.437,2.75) 4(-4.437,2.25) 5(-4.437,1.75) 6(-4.437,1.25) 7(-4.437,0.75) 8(-4.437,0.25) 9(-4.437,-0.25) 10(-4.437,-0.75) 11(-4.437,-1.25) 12(-4.437,-1.75) 13(-4.437,-2.25) 14(-4.437,-2.75) 15(-4.437,-3.25) 16(-4.437,-3.75) 33(4.437,-3.75) 34(4.437,-3.25) 35(4.437,-2.75) 36(4.437,-2.25) 37(4.437,-1.75) 38(4.437,-1.25) 39(4.437,-0.75) 40(4.437,-0.25) 41(4.437,0.25) 42(4.437,0.75) 43(4.437,1.25) 44(4.437,1.75) 45(4.437,2.25) 46(4.437,2.75) 47(4.437,3.25) 48(4.437,3.75)
  rrect25% 0.3x0.875 smd: 17(-3.75,-4.437) 18(-3.25,-4.437) 19(-2.75,-4.437) 20(-2.25,-4.437) 21(-1.75,-4.437) 22(-1.25,-4.437) 23(-0.75,-4.437) 24(-0.25,-4.437) 25(0.25,-4.437) 26(0.75,-4.437) 27(1.25,-4.437) 28(1.75,-4.437) 29(2.25,-4.437) 30(2.75,-4.437) 31(3.25,-4.437) 32(3.75,-4.437) 49(3.75,4.437) 50(3.25,4.437) 51(2.75,4.437) 52(2.25,4.437) 53(1.75,4.437) 54(1.25,4.437) 55(0.75,4.437) 56(0.25,4.437) 57(-0.25,4.437) 58(-0.75,4.437) 59(-1.25,4.437) 60(-1.75,4.437) 61(-2.25,4.437) 62(-2.75,4.437) 63(-3.25,4.437) 64(-3.75,4.437)
  rect 5.45x5.45 smd: 65(0,0)
  rrect23% 1.1x1.1 on Top Paste: Un1(-0.68,-0.68) Un2(2.04,2.04) Un3(0.68,-0.68) Un4(2.04,-0.68) Un5(0.68,0.68) Un6(2.04,0.68) Un7(0.68,2.04) Un8(-0.68,0.68) Un9(-2.04,-2.04) Un10(-2.04,-0.68) Un11(-2.04,2.04) Un12(-2.04,0.68) Un13(-0.68,2.04) Un14(-0.68,-2.04) Un15(0.68,-2.04) Un16(2.04,-2.04)
F.SilkS:
  lines w0.12: -4.61,-4.16 -4.61,-4.61 -4.16,-4.61 ; -4.61,4.61 -4.16,4.61 ; 4.16,-4.61 4.61,-4.61 4.61,-4.16 ; 4.16,4.61 4.61,4.61 4.61,4.16
F.CrtYd:
  lines w0.05: -5.12,-5.12 5.12,-5.12 5.12,5.12 -5.12,5.12 -5.12,-5.12
F.Fab:
  lines w0.1: -4.5,-4.5 -4.5,3.5 -3.5,4.5 4.5,4.5 4.5,-4.5 -4.5,-4.5
  text "'.Designator'" at -4.047,-0.84 h1

## QFN-64-1EP_9x9mm_P0.5mm_EP5.45x5.45mm_ThermalVias [mm]
pads (107):
  rrect25% 0.875x0.3 smd: 1(-4.437,3.75) 2(-4.437,3.25) 3(-4.437,2.75) 4(-4.437,2.25) 5(-4.437,1.75) 6(-4.437,1.25) 7(-4.437,0.75) 8(-4.437,0.25) 9(-4.437,-0.25) 10(-4.437,-0.75) 11(-4.437,-1.25) 12(-4.437,-1.75) 13(-4.437,-2.25) 14(-4.437,-2.75) 15(-4.437,-3.25) 16(-4.437,-3.75) 33(4.437,-3.75) 34(4.437,-3.25) 35(4.437,-2.75) 36(4.437,-2.25) 37(4.437,-1.75) 38(4.437,-1.25) 39(4.437,-0.75) 40(4.437,-0.25) 41(4.437,0.25) 42(4.437,0.75) 43(4.437,1.25) 44(4.437,1.75) 45(4.437,2.25) 46(4.437,2.75) 47(4.437,3.25) 48(4.437,3.75)
  rrect25% 0.3x0.875 smd: 17(-3.75,-4.437) 18(-3.25,-4.437) 19(-2.75,-4.437) 20(-2.25,-4.437) 21(-1.75,-4.437) 22(-1.25,-4.437) 23(-0.75,-4.437) 24(-0.25,-4.437) 25(0.25,-4.437) 26(0.75,-4.437) 27(1.25,-4.437) 28(1.75,-4.437) 29(2.25,-4.437) 30(2.75,-4.437) 31(3.25,-4.437) 32(3.75,-4.437) 49(3.75,4.437) 50(3.25,4.437) 51(2.75,4.437) 52(2.25,4.437) 53(1.75,4.437) 54(1.25,4.437) 55(0.75,4.437) 56(0.25,4.437) 57(-0.25,4.437) 58(-0.75,4.437) 59(-1.25,4.437) 60(-1.75,4.437) 61(-2.25,4.437) 62(-2.75,4.437) 63(-3.25,4.437) 64(-3.75,4.437)
  round 0.5 hole 0.2: 65(-2.475,-2.475) 65(-2.475,-1.238) 65(-2.475,0) 65(-2.475,1.238) 65(-2.475,2.475) 65(-1.238,-2.475) 65(-1.238,-1.238) 65(-1.238,0) 65(-1.238,1.238) 65(-1.238,2.475) 65(0,-2.475) 65(0,-1.238) 65(0,0) 65(0,1.238) 65(0,2.475) 65(1.238,-2.475) 65(1.238,-1.238) 65(1.238,0) 65(1.238,1.238) 65(1.238,2.475) 65(2.475,-2.475) 65(2.475,-1.238) 65(2.475,0) 65(2.475,1.238) 65(2.475,2.475)
  rect 5.45x5.45 smd: 65(0,0)
  rect 5.45x5.45 smd far side: 65(0,0)
  rrect24% 1.055x1.055 on Top Paste: Un1(-0.619,0.619) Un2(-1.856,0.619) Un3(-1.856,1.856) Un4(0.619,1.856) Un5(1.856,0.619) Un6(-1.856,-1.856) Un7(1.856,1.856) Un8(-0.619,-1.856) Un9(-1.856,-0.619) Un10(0.619,-1.856) Un11(0.619,0.619) Un12(-0.619,1.856) Un13(0.619,-0.619) Un14(1.856,-1.856) Un15(1.856,-0.619) Un16(-0.619,-0.619)
F.SilkS:
  lines w0.12: -4.61,-4.16 -4.61,-4.61 -4.16,-4.61 ; -4.61,4.61 -4.16,4.61 ; 4.16,-4.61 4.61,-4.61 4.61,-4.16 ; 4.16,4.61 4.61,4.61 4.61,4.16
F.CrtYd:
  lines w0.05: -5.12,-5.12 -5.12,5.12 5.12,5.12 5.12,-5.12 -5.12,-5.12
F.Fab:
  lines w0.1: -4.5,-4.5 4.5,-4.5 4.5,4.5 -3.5,4.5 -4.5,3.5 -4.5,-4.5
  text "'.Designator'" at -4.047,-0.84 h1

## QFN-64-1EP_9x9mm_P0.5mm_EP6x6mm [mm]
pads (81):
  rrect25% 0.875x0.25 smd: 1(-4.437,3.75) 2(-4.437,3.25) 3(-4.437,2.75) 4(-4.437,2.25) 5(-4.437,1.75) 6(-4.437,1.25) 7(-4.437,0.75) 8(-4.437,0.25) 9(-4.437,-0.25) 10(-4.437,-0.75) 11(-4.437,-1.25) 12(-4.437,-1.75) 13(-4.437,-2.25) 14(-4.437,-2.75) 15(-4.437,-3.25) 16(-4.437,-3.75) 33(4.437,-3.75) 34(4.437,-3.25) 35(4.437,-2.75) 36(4.437,-2.25) 37(4.437,-1.75) 38(4.437,-1.25) 39(4.437,-0.75) 40(4.437,-0.25) 41(4.437,0.25) 42(4.437,0.75) 43(4.437,1.25) 44(4.437,1.75) 45(4.437,2.25) 46(4.437,2.75) 47(4.437,3.25) 48(4.437,3.75)
  rrect25% 0.25x0.875 smd: 17(-3.75,-4.437) 18(-3.25,-4.437) 19(-2.75,-4.437) 20(-2.25,-4.437) 21(-1.75,-4.437) 22(-1.25,-4.437) 23(-0.75,-4.437) 24(-0.25,-4.437) 25(0.25,-4.437) 26(0.75,-4.437) 27(1.25,-4.437) 28(1.75,-4.437) 29(2.25,-4.437) 30(2.75,-4.437) 31(3.25,-4.437) 32(3.75,-4.437) 49(3.75,4.437) 50(3.25,4.437) 51(2.75,4.437) 52(2.25,4.437) 53(1.75,4.437) 54(1.25,4.437) 55(0.75,4.437) 56(0.25,4.437) 57(-0.25,4.437) 58(-0.75,4.437) 59(-1.25,4.437) 60(-1.75,4.437) 61(-2.25,4.437) 62(-2.75,4.437) 63(-3.25,4.437) 64(-3.75,4.437)
  rect 6x6 smd: 65(0,0)
  rrect21% 1.21x1.21 on Top Paste: Un1(0.75,0.75) Un2(-0.75,2.25) Un3(-2.25,0.75) Un4(0.75,-2.25) Un5(-2.25,-2.25) Un6(-2.25,-0.75) Un7(2.25,-0.75) Un8(2.25,0.75) Un9(2.25,2.25) Un10(-0.75,-0.75) Un11(0.75,2.25) Un12(0.75,-0.75) Un13(-2.25,2.25) Un14(-0.75,-2.25) Un15(-0.75,0.75) Un16(2.25,-2.25)
F.SilkS:
  lines w0.12: -4.61,-4.135 -4.61,-4.61 -4.135,-4.61 ; -4.61,4.61 -4.135,4.61 ; 4.135,-4.61 4.61,-4.61 4.61,-4.135 ; 4.135,4.61 4.61,4.61 4.61,4.135
F.CrtYd:
  lines w0.05: -5.12,-5.12 5.12,-5.12 5.12,5.12 -5.12,5.12 -5.12,-5.12
F.Fab:
  lines w0.1: -4.5,-4.5 4.5,-4.5 4.5,4.5 -3.5,4.5 -4.5,3.5 -4.5,-4.5
  text "'.Designator'" at -4.047,-0.84 h1